# Altium footprint library mastermind.PCBLIB: 1061 footprints (part 45 of 67)
Each footprint in its own frame and in the unit in brackets; x right, y up, seen from the top. Pads: shape width x height; smd on the part's side, far side on the other; paste and mask are expansions set on the pad; w line width, h text height; cw(c..) or ccw(c..) is an arc to the next point about the centre after c.
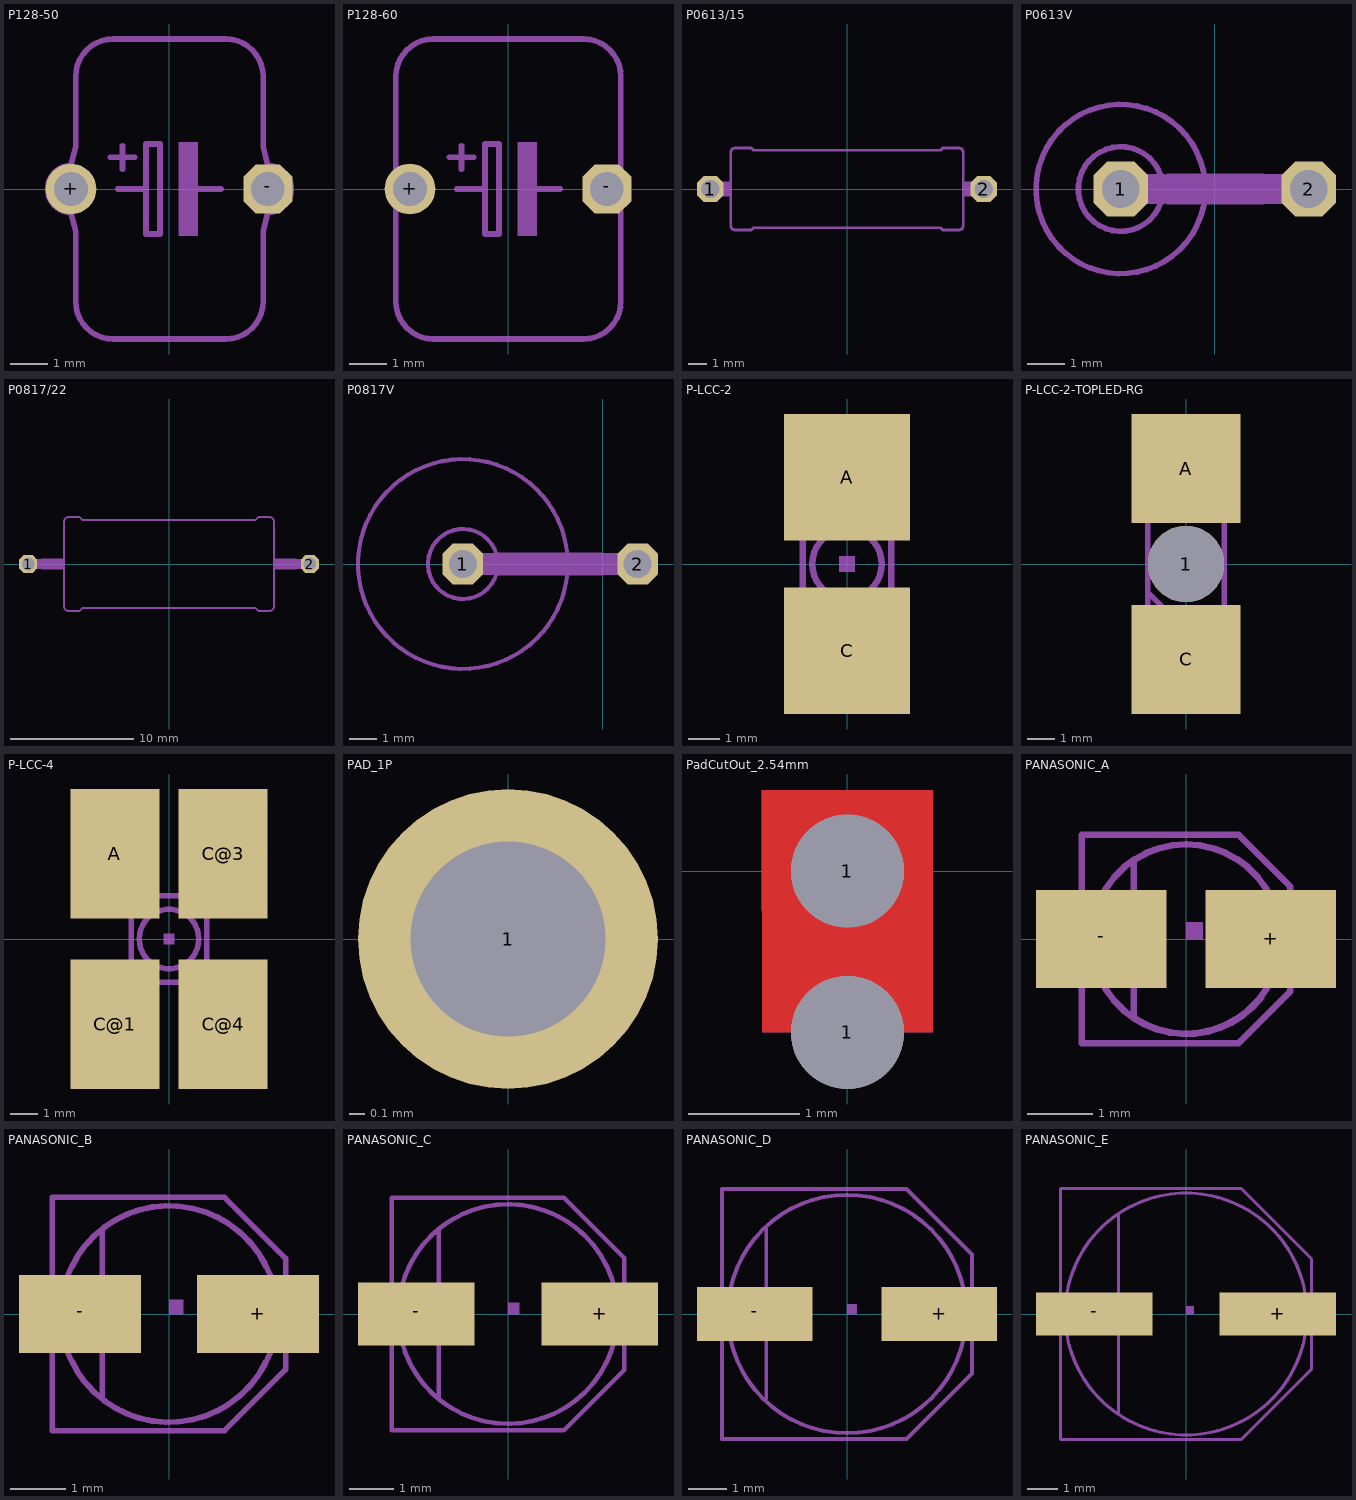
[diagram p44: the footprints below, top view; thin cyan lines are the x and y axes]

## P128-50 [mil]
pads (2):
  round 54 hole 36: +(-105,0)
  oct 52.29x52.29 hole 36: -(105,0)
Mechanical 2:
  region: 10,-50 10,50 30,50 30,-50
  lines w6: -100,-45 -100,-120 ccw(c-60,-120) -60,-160 60,-160 ccw(c60,-120) 100,-120 100,-45 ; -100,45 -100,120 cw(c-60,120) -60,160 60,160 cw(c60,120) 100,120 100,45 ; -63,34 -37,34 ; -55,0 -25,0 ; -50,21 -50,46 ; 25,0 55,0 ; -25,0 -25,48 -10,48 -10,-48 -25,-48 -25,0
Mechanical 8:
  lines w6: -100,-45 -105,-25 cw(c-105,0) -105,25 -100,45 ; 100,-45 105,-25 ccw(c105,0) 105,25 100,45

## P128-60 [mil]
pads (2):
  round 54 hole 36: +(-105,0)
  oct 52.29x52.29 hole 36: -(105,0)
Mechanical 2:
  region: 10,-50 10,50 30,50 30,-50
  lines w6: -120,-45 -120,-120 ccw(c-80,-120) -80,-160 80,-160 ccw(c80,-120) 120,-120 120,-45 ; -120,45 -120,120 cw(c-80,120) -80,160 80,160 cw(c80,120) 120,120 120,45 ; -63,34 -37,34 ; -55,0 -25,0 ; -50,21 -50,46 ; 25,0 55,0 ; -25,0 -25,48 -10,48 -10,-48 -25,-48 -25,0
Mechanical 8:
  lines w6: -120,-45 -120,45 ; 120,-45 120,45

## P0613/15 [mil]
pads (2):
  oct 58.09x58.09 hole 40: 1(-300,0) 2(300,0)
Mechanical 2:
  lines w6: -255,-25 -255,-80 ccw(c-245,-80) -245,-90 -210,-90 -205,-85 205,-85 210,-90 245,-90 ccw(c245,-80) 255,-80 255,-25 ; -255,25 -255,80 cw(c-245,80) -245,90 -210,90 -205,85 205,85 210,90 245,90 cw(c245,80) 255,80 255,25
Mechanical 8:
  region: 255,-16 255,16 277,16 277,-16
  region: -277,-16 -277,16 -255,16 -255,-16
  lines w6: -255,-25 -255,25 ; 255,-25 255,25
  lines w32: -300,0 -275,0 ; 275,0 300,0

## P0613V [mil]
pads (2):
  oct 58.09x58.09 hole 40: 1(-100,0) 2(100,0)
Mechanical 2:
  circle w6: c-100,0 r90
  region: -51,-16 -51,16 52,16 52,-16
Mechanical 8:
  circle w6: c-100,0 r45
  lines w32: -100,0 -55,0 ; 55,0 100,0

## P0817/22 [mil]
pads (2):
  oct 58.09x58.09 hole 40: 1(-450,0) 2(450,0)
Mechanical 2:
  region: -406,-16 -406,16 -335,16 -335,-16
  region: 335,-16 335,16 406,16 406,-16
  lines w6: -335,-135 ccw(c-320,-135) -320,-150 -285,-150 -275,-140 275,-140 285,-150 320,-150 ccw(c320,-135) 335,-135 335,135 ccw(c320,135) 320,150 285,150 275,140 -275,140 -285,150 -320,150 ccw(c-320,135) -335,135 -335,-135
Mechanical 8:
  lines w32: -450,0 -410,0 ; 410,0 450,0

## P0817V [mil]
pads (2):
  oct 58.09x58.09 hole 40: 1(-200,0) 2(50,0)
Mechanical 2:
  circle w6: c-200,0 r150
  region: -150,-16 -150,16 0,16 0,-16
Mechanical 8:
  circle w6: c-200,0 r50
  lines w32: -200,0 -150,0 ; 0,0 50,0

## P-LCC-2 [mm]
pads (2):
  rect 4x4 smd paste-2 mask-2: A(0,2.75) C(0,-2.75)
Top Paste:
  region: -1.3,-2.25 -1.3,-0.75 1.3,-0.75 1.3,-2.25
  region: -1.3,0.75 -1.3,2.25 1.3,2.25 1.3,0.75
Top Solder:
  region: -1.4,0.65 -1.4,2.35 1.4,2.35 1.4,0.65
  region: -1.4,-2.35 -1.4,-0.65 1.4,-0.65 1.4,-2.35
Mechanical 2:
  region: -0.25,-0.25 -0.25,0.25 0.25,0.25 0.25,-0.25
Mechanical 8:
  circle w0.203: c0,0 r1.1
  lines w0.102: -1.1,-1.6 -1.1,-1.8 1.1,-1.8 1.1,-1.6 ; -1.1,1.6 -1.1,1.8 1.1,1.8 1.1,1.6
  lines w0.203: -1.4,-1.05 -1.4,-1.6 -1.1,-1.6 -0.85,-1.6 ; -1.4,-1.05 -0.85,-1.6 ; -1.4,-1.05 -1.4,-0.65 -1.4,1.6 1.4,1.6 1.4,-1.6 1.1,-1.6 -0.85,-1.6

## P-LCC-2-TOPLED-RG [mm]
pads (3):
  round 2.8 hole 2.8: 1(0,0)
  rect 4x4 smd paste-2 mask-2: A(0,3.5) C(0,-3.5)
Top Paste:
  region: -1.3,-3 -1.3,-1.5 1.3,-1.5 1.3,-3
  region: -1.3,1.5 -1.3,3 1.3,3 1.3,1.5
Top Solder:
  region: -1.5,1.5 -1.5,3.2 1.5,3.2 1.5,1.5
  region: -1.5,-3.2 -1.5,-1.5 1.5,-1.5 1.5,-3.2
Mechanical 2:
  circle w0.203: c0,0 r1.1
  region: -0.25,-0.25 -0.25,0.25 0.25,0.25 0.25,-0.25
Mechanical 8:
  region: -1.15,2.4 -1.15,2.7 1.15,2.7 1.15,2.4
  region: -1.15,-2.7 -1.15,-2.4 1.15,-2.4 1.15,-2.7
  lines w0.102: -1.1,-2.45 -1.1,-1.6 ; -1.1,1.6 -1.1,2.45 ; 1.1,-2.45 1.1,-1.6 ; 1.1,1.6 1.1,2.45
  lines w0.203: -1.4,-1.05 -1.4,-1.6 -1.1,-1.6 -0.85,-1.6 ; -1.4,-1.05 -0.85,-1.6 ; -1.4,-1.05 -1.4,1.6 1.4,1.6 1.4,-1.6 1.1,-1.6 -0.85,-1.6

## P-LCC-4 [mm]
pads (4):
  rect 3.3x4.8 smd paste-2.4 mask-2.4: A(-2,3.15) C@1(-2,-3.15) C@3(2,3.15) C@4(2,-3.15)
Top Paste:
  region: -1.1,0.8 -1.1,1.8 -0.4,1.8 -0.4,0.8
  region: 0.4,0.8 0.4,1.8 1.1,1.8 1.1,0.8
  region: 0.4,-1.8 0.4,-0.8 1.1,-0.8 1.1,-1.8
  region: -1.1,-1.8 -1.1,-0.8 -0.4,-0.8 -0.4,-1.8
Top Solder:
  region: -1.15,-1.85 -1.15,-0.75 -0.35,-0.75 -0.35,-1.85
  region: 0.35,-1.85 0.35,-0.75 1.15,-0.75 1.15,-1.85
  region: 0.35,0.75 0.35,1.85 1.15,1.85 1.15,0.75
  region: -1.15,0.75 -1.15,1.85 -0.35,1.85 -0.35,0.75
Mechanical 2:
  region: -0.2,-0.2 -0.2,0.2 0.2,0.2 0.2,-0.2
Mechanical 8:
  circle w0.203: c0,0 r1.1
  lines w0.102: -1,-1.6 -1,-1.8 -0.5,-1.8 -0.5,-1.65 ; -1,1.6 -1,1.8 -0.5,1.8 -0.5,1.65 ; 0.5,-1.65 0.5,-1.8 1,-1.8 1,-1.6 ; 0.5,1.65 0.5,1.8 1.1,1.8 1.1,1.6
  lines w0.203: -1.4,-1.05 -1.4,-0.65 -1.4,1.6 -1,1.6 1.4,1.6 1.4,-1.6 1,-1.6 -0.85,-1.6 ; -1.4,-1.05 -0.85,-1.6 ; -1.4,-1.05 -1.4,-1.6 -1,-1.6 -0.85,-1.6

## PAD_1P [mm]
pads (1):
  round 2 hole 1.3: 1(0,0)

## PadCutOut_2.54mm [mil]
pads (2):
  round 40 hole 40: 1(0,-57.09) 1(0,0)
Top Layer:
  region: -30.22,-57.09 30.22,-57.09 30.22,28.54 -30.32,28.54
Bottom Layer:
  region: -30.22,-57.09 30.22,-57.09 30.22,28.54 -30.32,28.54
Top Solder:
  region: -30.46,-56.59 29.97,-56.59 29.97,29.04 -30.56,29.04
Bottom Solder:
  region: -30.43,-56.81 30,-56.81 30,28.81 -30.53,28.81
Mechanical 8:
  region: -10,-10 -10,10 10,10 10,-10

## PANASONIC_A [mm]
pads (2):
  rect 2x1.5 smd: +(1.3,0) -(-1.3,0)
Mechanical 2:
  lines w0.102: -1.6,-0.95 -1.6,-1.6 0.8,-1.6 1.5,-0.9 ; -1.6,0.95 -1.6,1.6 0.8,1.6 1.5,0.9 ; -1.1,-0.95 ccw(c0.004,0) 1.15,-0.9 ; -1.1,0.95 cw(c0,0) 1.1,0.95
Mechanical 8:
  circle w0.102: c0,0 r1.45
  region: 0,0 0.254,0 0.254,0.254 0,0.254
  region: 1.45,-0.3 1.45,0.3 1.8,0.3 1.8,-0.3
  region: -1.8,-0.3 -1.8,0.3 -1.45,0.3 -1.45,-0.3
  lines w0.102: -0.8,-1.2 -0.8,1.2 ; -1.6,-1.6 -1.6,1.6 0.8,1.6 1.6,0.8 1.6,-0.8 0.8,-1.6 -1.6,-1.6

## PANASONIC_B [mm]
pads (2):
  rect 2.2x1.4 smd: +(1.6,0) -(-1.6,0)
Mechanical 2:
  lines w0.102: -2.1,-0.85 -2.1,-2.1 1,-2.1 2.1,-1 ; -2.1,0.85 -2.1,2.1 1,2.1 2.1,1 ; -1.75,-0.85 ccw(c0,0) 1.75,-0.85 ; -1.75,0.85 cw(c0,0) 1.75,0.85
Mechanical 8:
  circle w0.102: c0,0 r1.95
  region: 0,0 0.254,0 0.254,0.254 0,0.254
  region: 1.9,-0.35 1.9,0.35 2.3,0.35 2.3,-0.35
  region: -2.3,-0.35 -2.3,0.35 -1.85,0.35 -1.85,-0.35
  lines w0.102: -1.2,-1.5 -1.2,1.5 ; -2.1,-2.1 -2.1,2.1 1,2.1 2.1,1 2.1,-1 1,-2.1 -2.1,-2.1

## PANASONIC_C [mm]
pads (2):
  rect 2.6x1.4 smd: +(2.05,0) -(-2.05,0)
Mechanical 2:
  lines w0.102: -2.6,-0.95 -2.6,-2.6 1.25,-2.6 2.6,-1.25 2.6,-0.95 ; -2.6,0.95 -2.6,2.6 1.25,2.6 2.6,1.25 2.6,0.95 ; -2.3,-0.85 ccw(c0,0) 2.3,-0.85 ; -2.3,0.85 cw(c0,0) 2.3,0.85
Mechanical 8:
  circle w0.102: c0,0 r2.45
  region: 0,0 0.254,0 0.254,0.254 0,0.254
  region: 2.4,-0.35 2.4,0.35 2.95,0.35 2.95,-0.35
  region: -2.95,-0.35 -2.95,0.35 -2.4,0.35 -2.4,-0.35
  lines w0.102: -1.55,-1.85 -1.55,1.85 ; -2.6,-2.6 -2.6,2.6 1.25,2.6 2.6,1.25 2.6,-1.25 1.25,-2.6 -2.6,-2.6

## PANASONIC_D [mm]
pads (2):
  rect 3x1.4 smd: +(2.4,0) -(-2.4,0)
Mechanical 2:
  lines w0.102: -3.25,-0.95 -3.25,-3.25 1.55,-3.25 3.25,-1.55 3.25,-0.95 ; -3.25,0.95 -3.25,3.25 1.55,3.25 3.25,1.55 3.25,0.95 ; -2.95,-0.95 ccw(c0,0) 2.95,-0.95 ; -2.95,0.95 cw(c0,0) 2.95,0.95
Mechanical 8:
  circle w0.102: c0,0 r3.1
  region: -3.65,-0.35 -3.65,0.35 -3.05,0.35 -3.05,-0.35
  region: 3.05,-0.35 3.05,0.35 3.65,0.35 3.65,-0.35
  region: 0,0 0.254,0 0.254,0.254 0,0.254
  lines w0.102: -2.1,-2.2 -2.1,2.25 ; -3.25,-3.25 1.55,-3.25 3.25,-1.55 3.25,1.55 1.55,3.25 -3.25,3.25 -3.25,-3.25

## PANASONIC_E [mm]
pads (2):
  rect 3.8x1.4 smd: +(3,0) -(-3,0)
Mechanical 2:
  lines w0.102: -4.1,-0.9 -4.1,-4.1 1.8,-4.1 4.1,-1.8 4.1,-0.9 ; -4.1,0.9 -4.1,4.1 1.8,4.1 4.1,1.8 4.1,0.9 ; -3.85,-0.9 ccw(c0,0) 3.85,-0.9 ; -3.85,0.9 cw(c0,0) 3.85,0.9
Mechanical 8:
  circle w0.102: c0,0 r3.95
  region: -4.5,-0.35 -4.5,0.35 -3.8,0.35 -3.8,-0.35
  region: 3.8,-0.35 3.8,0.35 4.5,0.35 4.5,-0.35
  region: 0,0 0.254,0 0.254,0.254 0,0.254
  lines w0.102: -2.2,-3.25 -2.2,3.25 ; -4.1,-4.1 1.8,-4.1 4.1,-1.8 4.1,1.8 1.8,4.1 -4.1,4.1 -4.1,-4.1